# Altium footprint library Connectors THD.PcbLib: 631 footprints (part 39 of 46) (continued)
## TYCO_1-794065-0 [mm] "8 Circuits Double Row Vertiacal Mini-Universal MATE-N-LOK Connector"
height 14.25
pads (9):
  round 2.1 hole 1.4: 1(6.21,2.07) 2(2.07,2.07) 3(-2.07,2.07) 4(-6.21,2.07) 5(6.21,-2.07) 6(2.07,-2.07) 7(-2.07,-2.07) 8(-6.21,-2.07)
  round 1 hole 3.2 unplated mask+1.2: 9(10.655,2.07)
Top Overlay:
  lines w0.2: -9.055,-4.915 9.055,-4.915 9.055,1 ; -9.055,-3.34 -11.645,-3.34 -11.645,-0.8 -9.055,-0.8 ; -7.912,-4.915 -7.912,-5.677 -9.055,-5.677 -9.055,4.915 9.055,4.915 9.055,3.2 ; -4.915,-4.915 -4.915,-5.677 -3.772,-5.677 -3.772,-4.915 ; -1.499,4.915 -1.499,6.21 1.499,6.21 1.499,4.915 ; -0.775,-4.915 -0.775,-5.677 0.368,-5.677 0.368,-4.915 ; 3.365,-4.915 3.365,-5.677 4.508,-5.677 4.508,-4.915 ; 7.505,-4.915 7.505,-5.677 8.648,-5.677 8.648,-4.915 ; 9.69,0.234 9.69,0.527 ; 9.69,0.255 ccw(c10.452,2.07) 11.62,0.486 ; 9.69,3.592 9.69,3.885 cw(c10.452,2.07) 11.62,3.654 ; -7.988,-3.848 -4.432,-3.848 -4.432,-0.292 -7.988,-0.292 -7.988,-3.848 ; -7.988,1.384 -6.896,0.292 -4.432,0.292 -4.432,3.848 -6.896,3.848 -7.988,2.756 -7.988,1.384 ; -3.848,-3.848 -0.292,-3.848 -0.292,-0.292 -3.848,-0.292 -3.848,-3.848 ; -3.848,0.292 -3.848,3.848 -0.292,3.848 -0.292,0.292 -3.848,0.292 ; 0.292,-3.848 0.292,-0.292 3.848,-0.292 3.848,-3.848 0.292,-3.848 ; 0.292,0.292 0.292,3.848 3.848,3.848 3.848,0.292 0.292,0.292 ; 4.432,-3.848 7.988,-3.848 7.988,-0.292 4.432,-0.292 4.432,-3.848 ; 4.432,0.292 6.896,0.292 7.988,1.384 7.988,2.756 6.896,3.848 4.432,3.848 4.432,0.292
  text "8" at -5.69,-5.907 h1.02
  text "7" at -1.55,-5.907 h1.02
  text "6" at 2.59,-5.907 h1.02
  text "5" at 6.73,-5.907 h1.02
  text "4" at -5.655,5.23 h1.02
  text "3" at -1.99,5.23 h1.02
  text "2" at 3.125,5.28 h1.02
  text "1" at 6.765,5.43 h1.02
Mechanical 8:
  lines w0.1: -7.21,-2.07 -6.21,-2.07 ; -7.21,2.07 -6.21,2.07 ; -6.21,-3.07 -6.21,-2.07 ; -6.21,-1.07 -6.21,-2.07 ; -6.21,1.07 -6.21,2.07 ; -6.21,3.07 -6.21,2.07 ; -5.21,-2.07 -6.21,-2.07 ; -5.21,2.07 -6.21,2.07 ; -3.07,-2.07 -2.07,-2.07 ; -3.07,2.07 -2.07,2.07 ; -2.07,-3.07 -2.07,-2.07 ; -2.07,-1.07 -2.07,-2.07 ; -2.07,1.07 -2.07,2.07 ; -2.07,3.07 -2.07,2.07 ; -1.07,-2.07 -2.07,-2.07 ; -1.07,2.07 -2.07,2.07 ; -1,0 0,0 ; 0,-1 0,0 ; 0,1 0,0 ; 1,0 0,0 ; 1.07,-2.07 2.07,-2.07 ; 1.07,2.07 2.07,2.07 ; 2.07,-3.07 2.07,-2.07 ; 2.07,-1.07 2.07,-2.07 ; 2.07,1.07 2.07,2.07 ; 2.07,3.07 2.07,2.07 ; 3.07,-2.07 2.07,-2.07 ; 3.07,2.07 2.07,2.07 ; 5.21,-2.07 6.21,-2.07 ; 5.21,2.07 6.21,2.07 ; 6.21,-3.07 6.21,-2.07 ; 6.21,-1.07 6.21,-2.07 ; 6.21,1.07 6.21,2.07 ; 6.21,3.07 6.21,2.07 ; 7.21,-2.07 6.21,-2.07 ; 7.21,2.07 6.21,2.07 ; 9.655,2.07 10.655,2.07 ; 10.655,1.07 10.655,2.07 ; 10.655,3.07 10.655,2.07 ; 11.655,2.07 10.655,2.07
Mechanical 14:
  drawing of 172 lines, arcs and shapes, not listed
  text "8" at -5.69,-5.907 h1.02
  text "7" at -1.55,-5.907 h1.02
  text "6" at 2.59,-5.907 h1.02
  text "5" at 6.73,-5.907 h1.02
  text "4" at -5.655,5.23 h1.02
  text "3" at -1.99,5.23 h1.02
  text "2" at 3.125,5.28 h1.02
  text "1" at 6.765,5.43 h1.02
3D body: height 14.25, standoff -4.06, extent -11.645,-5.677 11.62,6.21

## TYCO_1-794068-0 [mm] "16 Circuits Double Row Vertiacal Mini-Universal MATE-N-LOK Connector"
height 14.25
pads (18):
  round 2.1 hole 1.4: 1(14.491,1.816) 2(10.351,1.816) 3(6.21,1.816) 4(2.07,1.816) 5(-2.07,1.816) 6(-6.21,1.816) 7(-10.351,1.816) 8(-14.491,1.816) 9(14.491,-2.324) 10(10.351,-2.324) 11(6.21,-2.324) 12(2.07,-2.324) 13(-2.07,-2.324) 14(-6.21,-2.324) 15(-10.351,-2.324) 16(-14.491,-2.324)
  round 1 hole 3.2 unplated mask+1.2: 17(18.941,1.816) 18(-18.941,1.816)
Top Overlay:
  lines w0.2: -19.926,0.251 ccw(c-18.733,1.816) -17.996,-0.009 -17.996,0.284 ; -19.926,3.381 cw(c-18.733,1.816) -17.996,3.642 -17.996,3.348 ; -16.193,-5.169 -16.193,-5.931 -17.336,-5.931 -17.336,-5.169 ; -15.31,-5.169 -17.336,-5.169 ; -13.31,-5.169 17.336,-5.169 17.336,4.661 -17.336,4.661 -17.336,-5.169 ; -13.195,-5.169 -13.195,-5.931 -12.052,-5.931 -12.052,-5.169 ; -9.055,-5.169 -9.055,-5.931 -7.912,-5.931 -7.912,-5.169 ; -4.915,-5.169 -4.915,-5.931 -3.772,-5.931 -3.772,-5.169 ; -1.499,4.661 -1.499,5.956 1.499,5.956 1.499,4.661 ; -0.775,-5.169 -0.775,-5.931 0.368,-5.931 0.368,-5.169 ; 3.366,-5.169 3.366,-5.931 4.509,-5.931 4.509,-5.169 ; 7.506,-5.169 7.506,-5.931 8.649,-5.931 8.649,-5.169 ; 11.646,-5.169 11.646,-5.931 12.789,-5.931 12.789,-5.169 ; 15.786,-5.169 15.786,-5.931 16.929,-5.931 16.929,-5.169 ; 17.996,0.284 17.996,-0.009 ccw(c18.733,1.816) 19.926,0.251 ; 17.996,3.348 17.996,3.642 cw(c18.733,1.816) 19.926,3.381 ; -16.269,-4.102 -16.269,-1.638 -15.177,-0.546 -13.805,-0.546 -12.713,-1.638 -12.713,-4.102 -16.269,-4.102 ; -16.269,0.038 -12.713,0.038 -12.713,3.594 -16.269,3.594 -16.269,0.038 ; -12.129,-4.102 -8.573,-4.102 -8.573,-0.546 -12.129,-0.546 -12.129,-4.102 ; -12.129,0.038 -8.573,0.038 -8.573,3.594 -12.129,3.594 -12.129,0.038 ; -7.988,-4.102 -7.988,-1.638 -6.896,-0.546 -5.525,-0.546 -4.432,-1.638 -4.432,-4.102 -7.988,-4.102 ; -7.988,0.038 -7.988,2.502 -6.896,3.594 -5.525,3.594 -4.432,2.502 -4.432,0.038 -7.988,0.038 ; -3.848,-4.102 -0.292,-4.102 -0.292,-0.546 -3.848,-0.546 -3.848,-4.102 ; -3.848,0.038 -0.292,0.038 -0.292,3.594 -3.848,3.594 -3.848,0.038 ; 0.292,-4.102 3.848,-4.102 3.848,-0.546 0.292,-0.546 0.292,-4.102 ; 0.292,0.038 3.848,0.038 3.848,3.594 0.292,3.594 0.292,0.038 ; 4.432,-3.01 4.432,-1.638 5.525,-0.546 7.988,-0.546 7.988,-4.102 5.525,-4.102 4.432,-3.01 ; 4.432,1.13 4.432,2.502 5.525,3.594 7.988,3.594 7.988,0.038 5.525,0.038 4.432,1.13 ; 8.573,-4.102 12.129,-4.102 12.129,-0.546 8.573,-0.546 8.573,-4.102 ; 8.573,0.038 12.129,0.038 12.129,3.594 8.573,3.594 8.573,0.038 ; 12.713,-4.102 15.177,-4.102 16.269,-3.01 16.269,-1.638 15.177,-0.546 12.713,-0.546 12.713,-4.102 ; 12.713,0.038 16.269,0.038 16.269,3.594 12.713,3.594 12.713,0.038
  text "1" at 14.893,3.906 h1
  text "16" at -13.92,-5.907 h1
  text "9" at 14.96,-4.891 h1
  text "8" at -14.072,3.745 h1
Mechanical 8:
  lines w0.1: -19.941,1.816 -18.941,1.816 ; -18.941,0.816 -18.941,1.816 ; -18.941,2.816 -18.941,1.816 ; -17.941,1.816 -18.941,1.816 ; -15.491,-2.324 -14.491,-2.324 ; -15.491,1.816 -14.491,1.816 ; -14.491,-3.324 -14.491,-2.324 ; -14.491,-1.324 -14.491,-2.324 ; -14.491,0.816 -14.491,1.816 ; -14.491,2.816 -14.491,1.816 ; -13.491,-2.324 -14.491,-2.324 ; -13.491,1.816 -14.491,1.816 ; -11.351,-2.324 -10.351,-2.324 ; -11.351,1.816 -10.351,1.816 ; -10.351,-3.324 -10.351,-2.324 ; -10.351,-1.324 -10.351,-2.324 ; -10.351,0.816 -10.351,1.816 ; -10.351,2.816 -10.351,1.816 ; -9.351,-2.324 -10.351,-2.324 ; -9.351,1.816 -10.351,1.816 ; -7.21,-2.324 -6.21,-2.324 ; -7.21,1.816 -6.21,1.816 ; -6.21,-3.324 -6.21,-2.324 ; -6.21,-1.324 -6.21,-2.324 ; -6.21,0.816 -6.21,1.816 ; -6.21,2.816 -6.21,1.816 ; -5.21,-2.324 -6.21,-2.324 ; -5.21,1.816 -6.21,1.816 ; -3.07,-2.324 -2.07,-2.324 ; -3.07,1.816 -2.07,1.816 ; -2.07,-3.324 -2.07,-2.324 ; -2.07,-1.324 -2.07,-2.324 ; -2.07,0.816 -2.07,1.816 ; -2.07,2.816 -2.07,1.816 ; -1.07,-2.324 -2.07,-2.324 ; -1.07,1.816 -2.07,1.816 ; -1,0 0,0 ; 0,-1 0,0 ; 0,1 0,0 ; 1,0 0,0 ; 1.07,-2.324 2.07,-2.324 ; 1.07,1.816 2.07,1.816 ; 2.07,-3.324 2.07,-2.324 ; 2.07,-1.324 2.07,-2.324 ; 2.07,0.816 2.07,1.816 ; 2.07,2.816 2.07,1.816 ; 3.07,-2.324 2.07,-2.324 ; 3.07,1.816 2.07,1.816 ; 5.21,-2.324 6.21,-2.324 ; 5.21,1.816 6.21,1.816 ; 6.21,-3.324 6.21,-2.324 ; 6.21,-1.324 6.21,-2.324 ; 6.21,0.816 6.21,1.816 ; 6.21,2.816 6.21,1.816 ; 7.21,-2.324 6.21,-2.324 ; 7.21,1.816 6.21,1.816 ; 9.351,-2.324 10.351,-2.324 ; 9.351,1.816 10.351,1.816 ; 10.351,-3.324 10.351,-2.324 ; 10.351,-1.324 10.351,-2.324 ; 10.351,0.816 10.351,1.816 ; 10.351,2.816 10.351,1.816 ; 11.351,-2.324 10.351,-2.324 ; 11.351,1.816 10.351,1.816 ; 13.491,-2.324 14.491,-2.324 ; 13.491,1.816 14.491,1.816 ; 14.491,-3.324 14.491,-2.324 ; 14.491,-1.324 14.491,-2.324 ; 14.491,0.816 14.491,1.816 ; 14.491,2.816 14.491,1.816 ; 15.491,-2.324 14.491,-2.324 ; 15.491,1.816 14.491,1.816 ; 17.941,1.816 18.941,1.816 ; 18.941,0.816 18.941,1.816 ; 18.941,2.816 18.941,1.816 ; 19.941,1.816 18.941,1.816
Mechanical 14:
  lines w0.1: -19.926,0.991 ccw(c-18.961,1.816) -17.996,0.991 ; -19.926,2.642 cw(c-18.961,1.816) -17.996,2.642 ; -17.336,1.054 -17.996,1.054 -17.996,-0.009 cw(c-18.733,1.816) -19.926,0.251 -19.926,3.381 cw(c-18.733,1.816) -17.996,3.642 -17.996,2.578 -17.336,2.578 ; -16.193,-5.169 -16.193,-5.931 -17.336,-5.931 -17.336,-5.169 ; -15.31,-5.169 -17.336,-5.169 ; -13.31,-5.169 17.336,-5.169 17.336,4.661 -17.336,4.661 -17.336,-5.169 ; -13.195,-5.169 -13.195,-5.931 -12.052,-5.931 -12.052,-5.169 ; -9.055,-5.169 -9.055,-5.931 -7.912,-5.931 -7.912,-5.169 ; -4.915,-5.169 -4.915,-5.931 -3.772,-5.931 -3.772,-5.169 ; -1.499,4.661 -1.499,5.956 1.499,5.956 1.499,4.661 ; -0.775,-5.169 -0.775,-5.931 0.368,-5.931 0.368,-5.169 ; 3.366,-5.169 3.366,-5.931 4.509,-5.931 4.509,-5.169 ; 7.506,-5.169 7.506,-5.931 8.649,-5.931 8.649,-5.169 ; 11.646,-5.169 11.646,-5.931 12.789,-5.931 12.789,-5.169 ; 15.786,-5.169 15.786,-5.931 16.929,-5.931 16.929,-5.169 ; 17.336,1.054 17.996,1.054 17.996,-0.009 ccw(c18.733,1.816) 19.926,0.251 19.926,3.381 ccw(c18.733,1.816) 17.996,3.642 17.996,2.578 17.336,2.578 ; 17.996,0.991 ccw(c18.961,1.816) 19.926,0.991 ; 17.996,2.642 cw(c18.961,1.816) 19.926,2.642 ; -16.269,-4.102 -16.269,-1.638 -15.177,-0.546 -13.805,-0.546 -12.713,-1.638 -12.713,-4.102 -16.269,-4.102 ; -16.269,0.038 -12.713,0.038 -12.713,3.594 -16.269,3.594 -16.269,0.038 ; -12.129,-4.102 -8.573,-4.102 -8.573,-0.546 -12.129,-0.546 -12.129,-4.102 ; -12.129,0.038 -8.573,0.038 -8.573,3.594 -12.129,3.594 -12.129,0.038 ; -7.988,-4.102 -4.432,-4.102 -4.432,-1.638 -5.525,-0.546 -6.896,-0.546 -7.988,-1.638 -7.988,-4.102 ; -7.988,0.038 -4.432,0.038 -4.432,2.502 -5.525,3.594 -6.896,3.594 -7.988,2.502 -7.988,0.038 ; -3.848,-4.102 -0.292,-4.102 -0.292,-0.546 -3.848,-0.546 -3.848,-4.102 ; -3.848,0.038 -0.292,0.038 -0.292,3.594 -3.848,3.594 -3.848,0.038 ; 0.292,-4.102 3.848,-4.102 3.848,-0.546 0.292,-0.546 0.292,-4.102 ; 0.292,0.038 3.848,0.038 3.848,3.594 0.292,3.594 0.292,0.038 ; 4.432,-3.01 4.432,-1.638 5.525,-0.546 7.988,-0.546 7.988,-4.102 5.525,-4.102 4.432,-3.01 ; 4.432,1.13 5.525,0.038 7.988,0.038 7.988,3.594 5.525,3.594 4.432,2.502 4.432,1.13 ; 8.573,-4.102 12.129,-4.102 12.129,-0.546 8.573,-0.546 8.573,-4.102 ; 8.573,0.038 12.129,0.038 12.129,3.594 8.573,3.594 8.573,0.038 ; 12.713,-4.102 15.177,-4.102 16.269,-3.01 16.269,-1.638 15.177,-0.546 12.713,-0.546 12.713,-4.102 ; 12.713,0.038 16.269,0.038 16.269,3.594 12.713,3.594 12.713,0.038
  text "1" at 14.893,3.906 h1
  text "16" at -13.92,-5.907 h1
  text "9" at 14.96,-4.891 h1
  text "8" at -14.072,3.745 h1
3D body: height 14.25, standoff -4.06, extent -19.926,-5.931 19.926,5.956

## TYCO_1-1337541-0 [mm] "50 Ohms  BNC Elbow PCB Socket With Mounting Posts"
height 35.5
pads (4):
  round 1.6 hole 0.9: 1(0,0) 2(-2.54,0)
  round 2.7 hole 2: 3(-5.08,-5.08) 3(5.08,5.08)
Top Overlay:
  circle w0.2: c0,0 r4.175
  circle w0.2: c0,0 r4.8
  lines w0.2: -7.38,-7.6 7.38,-7.6 ; -5.34,-3.248 cw(c0,0) -3.06,5.45 -1,5.45 ; -4,-7.6 -4,-8.2 -7.38,-8.2 -7.38,6 cw(c-5.78,6) -5.78,7.6 5.78,7.6 cw(c5.78,6) 7.38,6 7.38,-8.2 4,-8.2 4,-7.6 ; -3.248,-5.34 ccw(c0,0) 5.34,3.248 ; -1.847,-1.1 ccw(c0,0) -1.847,1.1 ; -1,-4.695 -1,-5.5 1,-5.5 1,-4.695 ; -1,4.695 -1,5.5 1,5.5 1,4.695 ; 1,5.45 3.06,5.45 cw(c0,0) 3.248,5.34
Mechanical 8:
  lines w0.1: -5.58,-5.08 -5.08,-5.08 ; -5.08,-5.58 -5.08,-5.08 ; -5.08,-4.58 -5.08,-5.08 ; -4.58,-5.08 -5.08,-5.08 ; -3.04,0 -2.54,0 ; -2.54,-0.5 -2.54,0 ; -2.54,0.5 -2.54,0 ; -2.04,0 -2.54,0 ; -0.5,0 0,0 ; 0,-0.5 0,0 ; 0,0.5 0,0 ; 0.5,0 0,0 ; 4.58,5.08 5.08,5.08 ; 5.08,4.58 5.08,5.08 ; 5.08,5.58 5.08,5.08 ; 5.58,5.08 5.08,5.08
Mechanical 14:
  circle w0.1: c0,0 r0.975
  circle w0.1: c0,0 r0.625
  circle w0.1: c0,0 r2.15
  circle w0.1: c0,0 r4.175
  circle w0.1: c0,0 r4.8
  lines w0.1: -7.38,-7.6 7.38,-7.6 ; -4,-7.6 -4,-8.2 -7.38,-8.2 -7.38,6 cw(c-5.78,6) -5.78,7.6 5.78,7.6 cw(c5.78,6) 7.38,6 7.38,-8.2 4,-8.2 4,-7.6 ; -1,-4.695 -1,-5.5 1,-5.5 1,-4.695 ; -1,4.695 -1,5.5 1,5.5 1,4.695 ; -1,5.45 -3.06,5.45 ccw(c0,0) 3.06,5.45 1,5.45 ; -0.757,-0.615 -0.507,-0.366 ; -0.757,0.615 -0.507,0.366 ; -0.615,-0.757 -0.366,-0.507 ; -0.615,0.757 -0.366,0.507 ; 0.366,-0.507 0.615,-0.757 ; 0.366,0.507 0.615,0.757 ; 0.507,-0.366 0.757,-0.615 ; 0.507,0.366 0.757,0.615
3D body: height 35.5, standoff -4.25, extent -7.38,-8.2 7.38,7.6

## TYCO_1-1337541-0_A [mm] "50 Ohms  BNC Elbow PCB Socket With Mounting Posts"
height 35.5
pads (4):
  round 1.6 hole 0.9: 1(0,0) 2(-2.54,0)
  round 2.7 hole 2: 3(-5.08,-5.08) 3(5.08,5.08)
Top Overlay:
  circle w0.2: c0,0 r4.175
  circle w0.2: c0,0 r4.8
  lines w0.2: -7.38,-7.6 7.38,-7.6 ; -5.34,-3.248 cw(c0,0) -3.06,5.45 -1,5.45 ; -4,-7.6 -4,-8.2 -7.38,-8.2 -7.38,6 cw(c-5.78,6) -5.78,7.6 5.78,7.6 cw(c5.78,6) 7.38,6 7.38,-8.2 4,-8.2 4,-7.6 ; -3.248,-5.34 ccw(c0,0) 5.34,3.248 ; -1.847,-1.1 ccw(c0,0) -1.847,1.1 ; -1,-4.695 -1,-5.5 1,-5.5 1,-4.695 ; -1,4.695 -1,5.5 1,5.5 1,4.695 ; 1,5.45 3.06,5.45 cw(c0,0) 3.248,5.34
Mechanical 8:
  lines w0.1: -5.58,-5.08 -5.08,-5.08 ; -5.08,-5.58 -5.08,-5.08 ; -5.08,-4.58 -5.08,-5.08 ; -4.58,-5.08 -5.08,-5.08 ; -3.04,0 -2.54,0 ; -2.54,-0.5 -2.54,0 ; -2.54,0.5 -2.54,0 ; -2.04,0 -2.54,0 ; -0.5,0 0,0 ; 0,-0.5 0,0 ; 0,0.5 0,0 ; 0.5,0 0,0 ; 4.58,5.08 5.08,5.08 ; 5.08,4.58 5.08,5.08 ; 5.08,5.58 5.08,5.08 ; 5.58,5.08 5.08,5.08
Mechanical 14:
  circle w0.1: c0,0 r0.975
  circle w0.1: c0,0 r0.625
  circle w0.1: c0,0 r2.15
  circle w0.1: c0,0 r4.175
  circle w0.1: c0,0 r4.8
  lines w0.1: -7.38,-7.6 7.38,-7.6 ; -4,-7.6 -4,-8.2 -7.38,-8.2 -7.38,6 cw(c-5.78,6) -5.78,7.6 5.78,7.6 cw(c5.78,6) 7.38,6 7.38,-8.2 4,-8.2 4,-7.6 ; -1,-4.695 -1,-5.5 1,-5.5 1,-4.695 ; -1,4.695 -1,5.5 1,5.5 1,4.695 ; -1,5.45 -3.06,5.45 ccw(c0,0) 3.06,5.45 1,5.45 ; -0.757,-0.615 -0.507,-0.366 ; -0.757,0.615 -0.507,0.366 ; -0.615,-0.757 -0.366,-0.507 ; -0.615,0.757 -0.366,0.507 ; 0.366,-0.507 0.615,-0.757 ; 0.366,0.507 0.615,0.757 ; 0.507,-0.366 0.757,-0.615 ; 0.507,0.366 0.757,0.615
3D body: height 15.07, standoff 14.3, extent -7.9,-7.9 7.9,7.9
3D body: height 17.6, standoff 15.1, extent -7,-8.083 7,8.083
3D body: height 35.5, standoff -4.25, extent -7.38,-8.2 7.38,7.6

## TYCO_1-1337542-0 [mm] "50 Ohms  BNC Elbow PCB Socket With Mounting Posts"
height 13.16
pads (4):
  round 1.6 hole 0.9: 1(-5.48,0) 2(-5.48,2.54)
  round 2.7 hole 2: 3(-0.4,-5.08) 3(-0.4,5.08)
Top Overlay:
  drawing of 177 lines, arcs and shapes, not listed
Mechanical 8:
  lines w0.1: -5.98,0 -5.48,0 ; -5.98,2.54 -5.48,2.54 ; -5.48,-0.5 -5.48,0 ; -5.48,0.5 -5.48,0 ; -5.48,2.04 -5.48,2.54 ; -5.48,3.04 -5.48,2.54 ; -4.98,0 -5.48,0 ; -4.98,2.54 -5.48,2.54 ; -0.9,-5.08 -0.4,-5.08 ; -0.9,5.08 -0.4,5.08 ; -0.5,0 0,0 ; -0.4,-5.58 -0.4,-5.08 ; -0.4,-4.58 -0.4,-5.08 ; -0.4,4.58 -0.4,5.08 ; -0.4,5.58 -0.4,5.08 ; 0,-0.5 0,0 ; 0,0.5 0,0 ; 0.1,-5.08 -0.4,-5.08 ; 0.1,5.08 -0.4,5.08 ; 0.5,0 0,0
Mechanical 14:
  drawing of 177 lines, arcs and shapes, not listed
3D body: height 13.16, standoff -4.3, extent -7.5,-7.35 28,7.35

## TYCO_1-1337542-0_a [mm] "50 Ohms  BNC Elbow PCB Socket With Mounting Posts"
height 13.16
pads (4):
  round 1.6 hole 0.9: 1(-5.48,0) 2(-5.48,2.54)
  round 2.7 hole 2: 3(-0.4,-5.08) 3(-0.4,5.08)
Top Overlay:
  drawing of 177 lines, arcs and shapes, not listed
Mechanical 8:
  lines w0.1: -5.98,0 -5.48,0 ; -5.98,2.54 -5.48,2.54 ; -5.48,-0.5 -5.48,0 ; -5.48,0.5 -5.48,0 ; -5.48,2.04 -5.48,2.54 ; -5.48,3.04 -5.48,2.54 ; -4.98,0 -5.48,0 ; -4.98,2.54 -5.48,2.54 ; -0.9,-5.08 -0.4,-5.08 ; -0.9,5.08 -0.4,5.08 ; -0.5,0 0,0 ; -0.4,-5.58 -0.4,-5.08 ; -0.4,-4.58 -0.4,-5.08 ; -0.4,4.58 -0.4,5.08 ; -0.4,5.58 -0.4,5.08 ; 0,-0.5 0,0 ; 0,0.5 0,0 ; 0.1,-5.08 -0.4,-5.08 ; 0.1,5.08 -0.4,5.08 ; 0.5,0 0,0
Mechanical 14:
  drawing of 177 lines, arcs and shapes, not listed
3D body: height 13.85, standoff -0.15, extent 7.67,-8.083 10.17,8.083
3D body: height 14.79, standoff -1.01, extent 6.9,-7.916 7.67,7.884
3D body: height 13.16, standoff -4.3, extent -7.5,-7.35 28,7.35

## TYCO_1-1393480-7 [mm] "Right Angle D-SUB 9 Female Contacts for PCB, with Grounding Straps, Without Grounding Indents, and Without Mating Connector Lock"
height 10.06
pads (11):
  round 1.5 hole 0.9: 1(-5.48,-1.27) 2(-2.74,-1.27) 3(0,-1.27) 4(2.74,-1.27) 5(5.48,-1.27) 6(-4.11,1.27) 7(-1.37,1.27) 8(1.37,1.27) 9(4.11,1.27)
  round 5.5 hole 3.2: 10(-12.5,0) 11(12.5,0)
Top Overlay:
  lines w0.2: -15.595,-0.586 -15.595,-2.92 ccw(c-13.995,-2.92) -13.995,-4.52 -11.195,-4.52 ccw(c-11.195,-2.92) -9.595,-2.92 -9.595,-1.218 ; -15.595,0.586 -15.595,10.48 15.595,10.48 15.595,0.586 ; -15.595,8.03 -11.595,8.03 -11.595,8.53 ; -15.595,8.53 -9.75,8.53 ; -15.595,10.03 15.595,10.03 ; -14.095,8.53 -14.095,10.48 ; -10.195,8.53 -10.195,10.03 ; -9.75,9.33 9.75,9.33 ; -9.75,10.03 -9.75,4.33 9.75,4.33 9.75,10.03 ; -9.595,1.218 -9.595,4.33 ; -8.19,10.48 -8.19,16.48 cw(c-7.89,16.48) -7.89,16.78 7.89,16.78 cw(c7.89,16.48) 8.19,16.48 8.19,10.48 ; 9.595,-1.218 9.595,-2.92 ccw(c11.195,-2.92) 11.195,-4.52 13.995,-4.52 ccw(c13.995,-2.92) 15.595,-2.92 15.595,-0.586 ; 9.595,1.218 9.595,4.33 ; 9.75,8.53 15.595,8.53 ; 10.195,8.53 10.195,10.03 ; 11.595,8.53 11.595,8.03 15.595,8.03 ; 14.095,8.53 14.095,10.48
  text "9" at 6.731,0.508 h1.5
  text "1" at -7.239,-2.032 h1.5
  text "5" at 6.731,-2.032 h1.5
  text "6" at -7.366,0.508 h1.5
Mechanical 8:
  lines w0.1: -15.595,8.53 0,8.53 15.595,8.53 ; -13,0 -12.5,0 ; -12.5,-0.5 -12.5,0 ; -12.5,0.5 -12.5,0 ; -12,0 -12.5,0 ; -5.98,-1.27 -5.48,-1.27 ; -5.48,-1.77 -5.48,-1.27 ; -5.48,-0.77 -5.48,-1.27 ; -4.98,-1.27 -5.48,-1.27 ; -4.61,1.27 -4.11,1.27 ; -4.11,0.77 -4.11,1.27 ; -4.11,1.77 -4.11,1.27 ; -3.61,1.27 -4.11,1.27 ; -3.24,-1.27 -2.74,-1.27 ; -2.74,-1.77 -2.74,-1.27 ; -2.74,-0.77 -2.74,-1.27 ; -2.24,-1.27 -2.74,-1.27 ; -1.87,1.27 -1.37,1.27 ; -1.37,0.77 -1.37,1.27 ; -1.37,1.77 -1.37,1.27 ; -0.87,1.27 -1.37,1.27 ; -0.5,-1.27 0,-1.27 ; -0.5,0 0,0 ; 0,-1.77 0,-1.27 ; 0,-0.77 0,-1.27 ; 0,-0.5 0,0 ; 0,0.5 0,0 ; 0.5,-1.27 0,-1.27 ; 0.5,0 0,0 ; 0.87,1.27 1.37,1.27 ; 1.37,0.77 1.37,1.27 ; 1.37,1.77 1.37,1.27 ; 1.87,1.27 1.37,1.27 ; 2.24,-1.27 2.74,-1.27 ; 2.74,-1.77 2.74,-1.27 ; 2.74,-0.77 2.74,-1.27 ; 3.24,-1.27 2.74,-1.27 ; 3.61,1.27 4.11,1.27 ; 4.11,0.77 4.11,1.27 ; 4.11,1.77 4.11,1.27 ; 4.61,1.27 4.11,1.27 ; 4.98,-1.27 5.48,-1.27 ; 5.48,-1.77 5.48,-1.27 ; 5.48,-0.77 5.48,-1.27 ; 5.98,-1.27 5.48,-1.27 ; 12,0 12.5,0 ; 12.5,-0.5 12.5,0 ; 12.5,0.5 12.5,0 ; 13,0 12.5,0
Mechanical 14:
  circle w0.1: c-12.5,0 r1.55
  circle w0.1: c12.5,0 r1.55
  lines w0.1: -15.595,8.03 -11.595,8.03 -11.595,8.53 ; -15.595,8.53 -9.75,8.53 ; -15.595,10.03 15.595,10.03 ; -14.095,8.53 -14.095,10.48 ; -10.195,8.53 -10.195,10.03 ; -9.75,9.33 9.75,9.33 ; -9.75,10.03 -9.75,4.33 9.75,4.33 9.75,10.03 ; -9.595,4.33 -9.595,-2.92 cw(c-11.195,-2.92) -11.195,-4.52 -13.995,-4.52 cw(c-13.995,-2.92) -15.595,-2.92 -15.595,10.48 15.595,10.48 15.595,-2.92 cw(c13.995,-2.92) 13.995,-4.52 11.195,-4.52 cw(c11.195,-2.92) 9.595,-2.92 9.595,4.33 ; -8.19,10.48 -8.19,16.48 cw(c-7.89,16.48) -7.89,16.78 7.89,16.78 cw(c7.89,16.48) 8.19,16.48 8.19,10.48 ; -5.78,4.33 -5.78,-1.42 -5.18,-1.42 -5.18,4.33 ; -4.41,4.33 -4.41,1.12 -3.81,1.12 -3.81,4.33 ; -3.04,4.33 -3.04,-1.42 -2.44,-1.42 -2.44,4.33 ; -1.67,4.33 -1.67,1.12 -1.07,1.12 -1.07,4.33 ; -0.3,4.33 -0.3,-1.42 0.3,-1.42 0.3,4.33 ; 1.07,4.33 1.07,1.12 1.67,1.12 1.67,4.33 ; 2.44,4.33 2.44,-1.42 3.04,-1.42 3.04,4.33 ; 3.81,4.33 3.81,1.12 4.41,1.12 4.41,4.33 ; 5.18,4.33 5.18,-1.42 5.78,-1.42 5.78,4.33 ; 9.75,8.53 15.595,8.53 ; 10.195,8.53 10.195,10.03 ; 11.595,8.53 11.595,8.03 15.595,8.03 ; 14.095,8.53 14.095,10.48
3D body: height 10.06, standoff -3.2, extent -15.595,-4.52 15.595,16.78

## TYCO_1-1734282-3 [mm] "Dual Stacked  Plug Over Receptacle Right Angled D-SUB 15 Pins Connector, With Threaded Insert UNC 4-40, And PCB Mount Retention"
height 31.98
pads (32):
  round 5.5 hole 3.2: 16(-16.65,-3.455) 17(16.65,-3.455)
  round 1.7 hole 1: L1(9.695,2.035) L2(6.925,2.035) L3(4.155,2.035) L4(1.385,2.035) L5(-1.385,2.035) L6(-4.155,2.035) L7(-6.925,2.035) L8(-9.695,2.035) L9(8.31,4.875) L10(5.54,4.875) L11(2.77,4.875) L12(0,4.875) L13(-2.77,4.875) L14(-5.54,4.875) L15(-8.31,4.875) U1(-9.695,-4.875) U2(-6.925,-4.875) U3(-4.155,-4.875) U4(-1.385,-4.875) U5(1.385,-4.875) U6(4.155,-4.875) U7(6.925,-4.875) U8(9.695,-4.875) U9(-8.31,-2.035) U10(-5.54,-2.035) U11(-2.77,-2.035) U12(0,-2.035) U13(2.77,-2.035) U14(5.54,-2.035) U15(8.31,-2.035)
Top Overlay:
  lines w0.2: -19.65,12.455 19.65,12.455 ; -19.6,-4.56 -19.6,-6.545 -13.8,-6.545 -13.8,-4.797 ; -19.6,-2.35 -19.6,10.455 ; -19.6,8.285 -13.6,8.285 ; -19.4,8.285 -19.4,7.085 -13.9,7.085 -13.9,8.285 13.9,8.285 13.9,7.085 19.4,7.085 19.4,8.285 ; -13.8,-2.113 -13.8,1.455 -13.6,1.88 ; -13.6,-4.242 -13.6,-6.695 13.6,-6.695 13.6,-4.242 ; -13.6,-2.668 -13.6,10.455 ; -13.087,12.955 -13.087,17.797 cw(c-12.187,17.797) -12.187,18.697 12.187,18.697 cw(c12.187,17.797) 13.087,17.797 13.087,12.955 ; 13.6,-2.668 13.6,10.455 ; 13.6,1.655 13.8,1.455 13.8,-2.113 ; 13.6,8.285 19.6,8.285 ; 13.8,-4.797 13.8,-6.545 19.6,-6.545 19.6,-4.56 ; 19.6,-2.35 19.6,10.451 ; -19.65,10.455 19.65,10.455 19.65,12.955 -19.65,12.955 -19.65,10.455
  text "15" at 9.881,-2.722 h1.5
  text "8" at 10.946,-5.637 h1.5
  text "1" at -11.779,-5.637 h1.5
  text "9" at -11.566,-2.797 h1.5
  text "15" at -12.041,4.163 h1.5
  text "8" at -12.179,1.273 h1.5
  text "1" at 11.346,1.273 h1.5
  text "9" at 9.881,4.188 h1.5
  text "UPPER" at -2.1,-0.65 h1
  text "LOWER" at -2.1,6.26 h1
Mechanical 8:
  lines w0.1: -19.65,12.955 19.65,12.955 ; -17.15,-3.455 -16.65,-3.455 ; -16.65,-3.955 -16.65,-3.455 ; -16.65,-2.955 -16.65,-3.455 ; -16.15,-3.455 -16.65,-3.455 ; -10.195,-4.875 -9.695,-4.875 ; -10.195,2.035 -9.695,2.035 ; -9.695,-5.375 -9.695,-4.875 ; -9.695,-4.375 -9.695,-4.875 ; -9.695,1.535 -9.695,2.035 ; -9.695,2.535 -9.695,2.035 ; -9.195,-4.875 -9.695,-4.875 ; -9.195,2.035 -9.695,2.035 ; -8.81,-2.035 -8.31,-2.035 ; -8.81,4.875 -8.31,4.875 ; -8.31,-2.535 -8.31,-2.035 ; -8.31,-1.535 -8.31,-2.035 ; -8.31,4.375 -8.31,4.875 ; -8.31,5.375 -8.31,4.875 ; -7.81,-2.035 -8.31,-2.035 ; -7.81,4.875 -8.31,4.875 ; -7.425,-4.875 -6.925,-4.875 ; -7.425,2.035 -6.925,2.035 ; -6.925,-5.375 -6.925,-4.875 ; -6.925,-4.375 -6.925,-4.875 ; -6.925,1.535 -6.925,2.035 ; -6.925,2.535 -6.925,2.035 ; -6.425,-4.875 -6.925,-4.875 ; -6.425,2.035 -6.925,2.035 ; -6.04,-2.035 -5.54,-2.035 ; -6.04,4.875 -5.54,4.875 ; -5.54,-2.535 -5.54,-2.035 ; -5.54,-1.535 -5.54,-2.035 ; -5.54,4.375 -5.54,4.875 ; -5.54,5.375 -5.54,4.875 ; -5.04,-2.035 -5.54,-2.035 ; -5.04,4.875 -5.54,4.875 ; -4.655,-4.875 -4.155,-4.875 ; -4.655,2.035 -4.155,2.035 ; -4.155,-5.375 -4.155,-4.875 ; -4.155,-4.375 -4.155,-4.875 ; -4.155,1.535 -4.155,2.035 ; -4.155,2.535 -4.155,2.035 ; -3.655,-4.875 -4.155,-4.875 ; -3.655,2.035 -4.155,2.035 ; -3.27,-2.035 -2.77,-2.035 ; -3.27,4.875 -2.77,4.875 ; -2.77,-2.535 -2.77,-2.035 ; -2.77,-1.535 -2.77,-2.035 ; -2.77,4.375 -2.77,4.875 ; -2.77,5.375 -2.77,4.875 ; -2.27,-2.035 -2.77,-2.035 ; -2.27,4.875 -2.77,4.875 ; -1.885,-4.875 -1.385,-4.875 ; -1.885,2.035 -1.385,2.035 ; -1.385,-5.375 -1.385,-4.875 ; -1.385,-4.375 -1.385,-4.875 ; -1.385,1.535 -1.385,2.035 ; -1.385,2.535 -1.385,2.035 ; -0.885,-4.875 -1.385,-4.875 ; -0.885,2.035 -1.385,2.035 ; -0.5,-2.035 0,-2.035 ; -0.5,0 0,0 ; -0.5,4.875 0,4.875 ; 0,-2.535 0,-2.035 ; 0,-1.535 0,-2.035 ; 0,-0.5 0,0 ; 0,0.5 0,0 ; 0,4.375 0,4.875 ; 0,5.375 0,4.875 ; 0.5,-2.035 0,-2.035 ; 0.5,0 0,0 ; 0.5,4.875 0,4.875 ; 0.885,-4.875 1.385,-4.875 ; 0.885,2.035 1.385,2.035 ; 1.385,-5.375 1.385,-4.875 ; 1.385,-4.375 1.385,-4.875 ; 1.385,1.535 1.385,2.035 ; 1.385,2.535 1.385,2.035 ; 1.885,-4.875 1.385,-4.875 ; 1.885,2.035 1.385,2.035 ; 2.27,-2.035 2.77,-2.035 ; 2.27,4.875 2.77,4.875 ; 2.77,-2.535 2.77,-2.035 ; 2.77,-1.535 2.77,-2.035 ; 2.77,4.375 2.77,4.875 ; 2.77,5.375 2.77,4.875 ; 3.27,-2.035 2.77,-2.035 ; 3.27,4.875 2.77,4.875 ; 3.655,-4.875 4.155,-4.875 ; 3.655,2.035 4.155,2.035 ; 4.155,-5.375 4.155,-4.875 ; 4.155,-4.375 4.155,-4.875 ; 4.155,1.535 4.155,2.035 ; 4.155,2.535 4.155,2.035 ; 4.655,-4.875 4.155,-4.875 ; 4.655,2.035 4.155,2.035 ; 5.04,-2.035 5.54,-2.035 ; 5.04,4.875 5.54,4.875 ; 5.54,-2.535 5.54,-2.035 ; 5.54,-1.535 5.54,-2.035 ; 5.54,4.375 5.54,4.875 ; 5.54,5.375 5.54,4.875 ; 6.04,-2.035 5.54,-2.035 ; 6.04,4.875 5.54,4.875 ; 6.425,-4.875 6.925,-4.875 ; 6.425,2.035 6.925,2.035 ; 6.925,-5.375 6.925,-4.875 ; 6.925,-4.375 6.925,-4.875 ; 6.925,1.535 6.925,2.035 ; 6.925,2.535 6.925,2.035 ; 7.425,-4.875 6.925,-4.875 ; 7.425,2.035 6.925,2.035 ; 7.81,-2.035 8.31,-2.035 ; 7.81,4.875 8.31,4.875 ; 8.31,-2.535 8.31,-2.035 ; 8.31,-1.535 8.31,-2.035 ; 8.31,4.375 8.31,4.875 ; 8.31,5.375 8.31,4.875 ; 8.81,-2.035 8.31,-2.035 ; 8.81,4.875 8.31,4.875 ; 9.195,-4.875 9.695,-4.875 ; 9.195,2.035 9.695,2.035 ; 9.695,-5.375 9.695,-4.875 ; 9.695,-4.375 9.695,-4.875 ; 9.695,1.535 9.695,2.035 ; 9.695,2.535 9.695,2.035 ; 10.195,-4.875 9.695,-4.875 ; 10.195,2.035 9.695,2.035 ; 16.15,-3.455 16.65,-3.455 ; 16.65,-3.955 16.65,-3.455 ; 16.65,-2.955 16.65,-3.455 ; 17.15,-3.455 16.65,-3.455
  text "PCB EDGE" at -3.725,11.475 h1
Mechanical 14:
  circle w0.1: c16.65,-3.455 r1.25
  circle w0.1: c-16.65,-3.455 r1.25
  lines w0.1: -19.65,12.455 19.65,12.455 ; -19.6,8.285 -13.6,8.285 ; -19.6,10.455 -19.6,-6.545 -13.8,-6.545 -13.8,1.455 -13.6,1.88 ; -19.4,8.285 -19.4,7.085 -13.9,7.085 -13.9,8.285 13.9,8.285 13.9,7.085 19.4,7.085 19.4,8.285 ; -17.76,-4.03 -17.3,-4.03 -17.3,-2.88 -17.76,-2.88 ; -17.225,-4.565 -17.225,-4.105 -16.075,-4.105 -16.075,-4.565 ; -17.225,-2.347 -17.225,-2.805 -16.075,-2.805 -16.075,-2.345 ; -15.542,-4.03 -16,-4.03 -16,-2.88 -15.54,-2.88 ; -13.6,10.455 -13.6,-6.695 13.6,-6.695 13.6,10.455 ; -13.087,12.955 -13.087,17.797 cw(c-12.187,17.797) -12.187,18.697 12.187,18.697 cw(c12.187,17.797) 13.087,17.797 13.087,12.955 ; 13.6,1.655 13.8,1.455 13.8,-6.545 19.6,-6.545 19.6,10.451 ; 13.6,8.285 19.6,8.285 ; 15.54,-4.03 16,-4.03 16,-2.88 15.54,-2.88 ; 16.075,-4.565 16.075,-4.105 17.225,-4.105 17.225,-4.565 ; 16.075,-2.347 16.075,-2.805 17.225,-2.805 17.225,-2.345 ; 17.758,-4.03 17.3,-4.03 17.3,-2.88 17.76,-2.88 ; -19.65,10.455 19.65,10.455 19.65,12.955 -19.65,12.955 -19.65,10.455
  text "UPPER" at -2.1,-0.65 h1
  text "LOWER" at -2.1,6.26 h1
  text "9" at 9.881,4.188 h1.5
  text "1" at 11.346,1.273 h1.5
  text "8" at -12.179,1.273 h1.5
  text "15" at -12.041,4.163 h1.5
  text "9" at -11.566,-2.797 h1.5
  text "1" at -11.779,-5.637 h1.5
  text "8" at 10.946,-5.637 h1.5
  text "15" at 9.881,-2.722 h1.5
3D body: height 31.7, standoff -3.6, extent -19.65,-6.695 19.65,18.755